# Altium schematic symbol library Linear Technology Comparators.SchLib: 630 symbols (part 16 of 16)
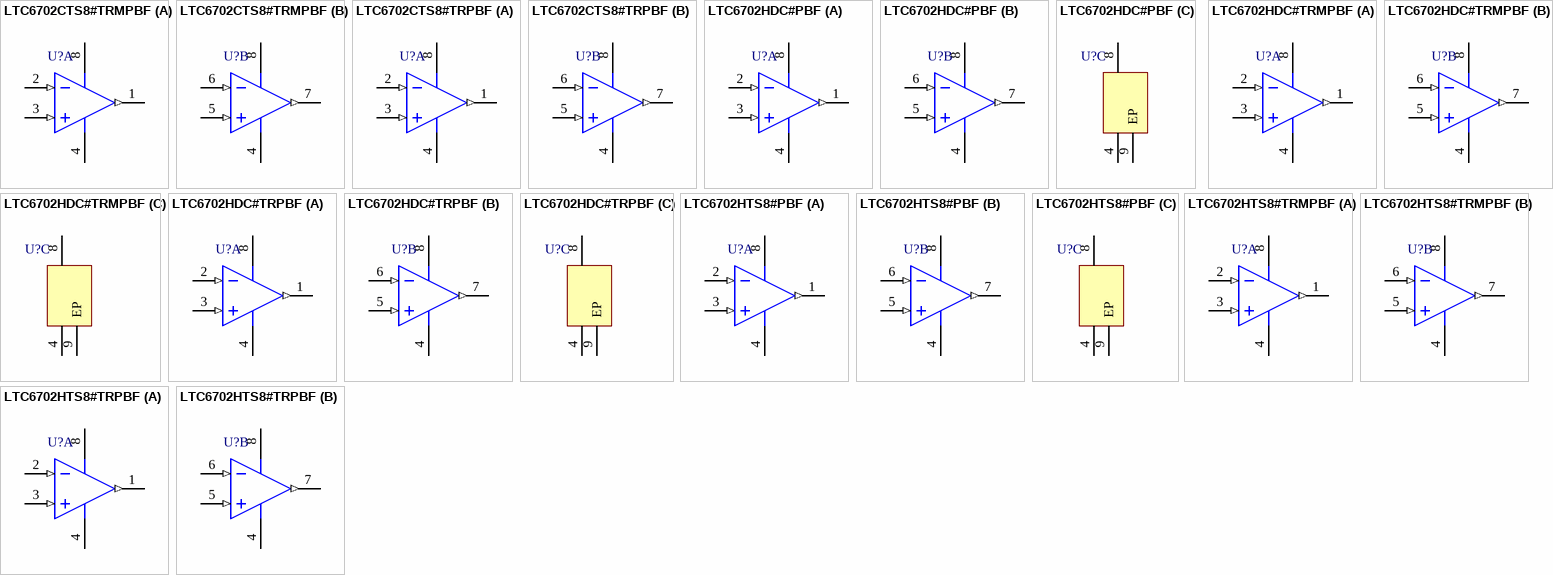
[diagram p39: symbols LTC6702CTS8#TRMPBF to LTC6702HTS8#TRPBF]

## LTC6702HDC#PBF
designator U?
Tiny Micropower, Low Voltage Comparator, 2 Channels, 1.7 to 5.5 V, -40 to +125 degC, 8-pin Plastic DFN (DC8); Generic Part Number: LTC6702; Manufacturer: Linear Technology; PartNumber: LTC6702HDC#PBF; Channels (#): 2; Prop Delay (us): 0.5; Supply Current (uA) Typical: 30; Vos (mV) Guaranteed: 3.5; Vos (mV) Typical: 1; Vs Max (V): 5.5; Vs Min (V): 1.5; DatasheetVersion: Rev A; PackageReference: DC8; PackageDescription: 8-Pin Plastic DFN, Body 2 x 2 mm, Pitch 1.37 mm; Features: Comparator; RoHS: Y; Supply Voltage Range: 1.7 to 5.5 V; Mounting Technology: Surface Mount; ComponentLink1Description: Manufacturer URL; ComponentLink1URL: http://www.linear.com/; ComponentLink2Description: Datasheet; ComponentLink2URL: http://cds.linear.com/docs/en/datasheet/6702fa.pdf; ComponentLink3Description: Package Specification; ComponentLink3URL: http://cds.linear.com/docs/en/packaging/DFN_8_05-08-1719.pdf
footprint LT-DC8_V (SON, 8-Leads, Body 2x2mm, Pitch 0.45mm, Thermal Pad 1.37x0.64mm, Recommended)
pins on every part: 4 GND (power) "Ground.", 8 V+ (power) "Positive Supply Voltage"
part A pins: 1 OUT A (out) "Output of Comparator A.", 2 -IN A (in) "Inverting Input of Comparator A.", 3 +IN A (in) "Noninverting Input of Comparator A."
part B pins: 5 +IN B (in) "Noninverting Input of Comparator B.", 6 -IN B (in) "Inverting Input of Comparator B.", 7 OUT B (out) "Output of Comparator B."
part C pins: 9 EP (power) "Ground. The Exposed Pad must be soldered to PCB."

## LTC6702HDC#TRMPBF
designator U?
Tiny Micropower, Low Voltage Comparator, 2 Channels, 1.7 to 5.5 V, -40 to +125 degC, 8-pin Plastic DFN (DC8), Mini Tape and Reel; Generic Part Number: LTC6702; Manufacturer: Linear Technology; PartNumber: LTC6702HDC#TRMPBF; Channels (#): 2; Prop Delay (us): 0.5; Supply Current (uA) Typical: 30; Vos (mV) Guaranteed: 3.5; Vos (mV) Typical: 1; Vs Max (V): 5.5; Vs Min (V): 1.5; DatasheetVersion: Rev A; PackageReference: DC8; PackageDescription: 8-Pin Plastic DFN, Body 2 x 2 mm, Pitch 1.37 mm; Supplier 1: Digi-Key; Supplier Part Number 1: LTC6702HDC#TRMPBFTR-ND; Supplier 2: Digi-Key; Supplier Part Number 2: LTC6702HDC#TRMPBFCT-ND; Supplier 3: Digi-Key; Supplier Part Number 3: LTC6702HDC#TRMPBFDKR-ND; Supplier 4: Farnell; Supplier Part Number 4: 1715059; Features: Comparator; RoHS: Y; Supply Voltage Range: 1.7 to 5.5 V; Mounting Technology: Surface Mount; ComponentLink1Description: Manufacturer URL; ComponentLink1URL: http://www.linear.com/; ComponentLink2Description: Datasheet; ComponentLink2URL: http://cds.linear.com/docs/en/datasheet/6702fa.pdf; ComponentLink3Description: Package Specification; ComponentLink3URL: http://cds.linear.com/docs/en/packaging/DFN_8_05-08-1719.pdf
footprint LT-DC8_V (SON, 8-Leads, Body 2x2mm, Pitch 0.45mm, Thermal Pad 1.37x0.64mm, Recommended)
pins on every part: 4 GND (power) "Ground.", 8 V+ (power) "Positive Supply Voltage"
part A pins: 1 OUT A (out) "Output of Comparator A.", 2 -IN A (in) "Inverting Input of Comparator A.", 3 +IN A (in) "Noninverting Input of Comparator A."
part B pins: 5 +IN B (in) "Noninverting Input of Comparator B.", 6 -IN B (in) "Inverting Input of Comparator B.", 7 OUT B (out) "Output of Comparator B."
part C pins: 9 EP (power) "Ground. The Exposed Pad must be soldered to PCB."

## LTC6702HDC#TRPBF
designator U?
Tiny Micropower, Low Voltage Comparator, 2 Channels, 1.7 to 5.5 V, -40 to +125 degC, 8-pin Plastic DFN (DC8), Tape and Reel; Generic Part Number: LTC6702; Manufacturer: Linear Technology; PartNumber: LTC6702HDC#TRPBF; Channels (#): 2; Prop Delay (us): 0.5; Supply Current (uA) Typical: 30; Vos (mV) Guaranteed: 3.5; Vos (mV) Typical: 1; Vs Max (V): 5.5; Vs Min (V): 1.5; DatasheetVersion: Rev A; PackageReference: DC8; PackageDescription: 8-Pin Plastic DFN, Body 2 x 2 mm, Pitch 1.37 mm; Supplier 1: Digi-Key; Supplier Part Number 1: LTC6702HDC#TRPBF-ND; Features: Comparator; RoHS: Y; Supply Voltage Range: 1.7 to 5.5 V; Mounting Technology: Surface Mount; ComponentLink1Description: Manufacturer URL; ComponentLink1URL: http://www.linear.com/; ComponentLink2Description: Datasheet; ComponentLink2URL: http://cds.linear.com/docs/en/datasheet/6702fa.pdf; ComponentLink3Description: Package Specification; ComponentLink3URL: http://cds.linear.com/docs/en/packaging/DFN_8_05-08-1719.pdf
footprint LT-DC8_V (SON, 8-Leads, Body 2x2mm, Pitch 0.45mm, Thermal Pad 1.37x0.64mm, Recommended)
pins on every part: 4 GND (power) "Ground.", 8 V+ (power) "Positive Supply Voltage"
part A pins: 1 OUT A (out) "Output of Comparator A.", 2 -IN A (in) "Inverting Input of Comparator A.", 3 +IN A (in) "Noninverting Input of Comparator A."
part B pins: 5 +IN B (in) "Noninverting Input of Comparator B.", 6 -IN B (in) "Inverting Input of Comparator B.", 7 OUT B (out) "Output of Comparator B."
part C pins: 9 EP (power) "Ground. The Exposed Pad must be soldered to PCB."

## LTC6702HTS8#PBF
designator U?
Tiny Micropower, Low Voltage Comparator, 2 Channels, 1.7 to 5.5 V, -40 to +125 degC, 8-pin Plastic DFN (DC8); Generic Part Number: LTC6702; Manufacturer: Linear Technology; PartNumber: LTC6702HTS8#PBF; Channels (#): 2; Prop Delay (us): 0.5; Supply Current (uA) Typical: 30; Vos (mV) Guaranteed: 3.5; Vos (mV) Typical: 1; Vs Max (V): 5.5; Vs Min (V): 1.5; DatasheetVersion: Rev A; PackageReference: DC8; PackageDescription: 8-Pin Plastic DFN, Body 2 x 2 mm, Pitch 1.37 mm; Supplier 1: Farnell; Supplier Part Number 1: 2308164; Supplier 2: Newark; Supplier Part Number 2: 78T3487; Features: Comparator; RoHS: Y; Supply Voltage Range: 1.7 to 5.5 V; Mounting Technology: Surface Mount; ComponentLink1Description: Manufacturer URL; ComponentLink1URL: http://www.linear.com/; ComponentLink2Description: Datasheet; ComponentLink2URL: http://cds.linear.com/docs/en/datasheet/6702fa.pdf; ComponentLink3Description: Package Specification; ComponentLink3URL: http://cds.linear.com/docs/en/packaging/DFN_8_05-08-1719.pdf
footprint LT-DC8_V (SON, 8-Leads, Body 2x2mm, Pitch 0.45mm, Thermal Pad 1.37x0.64mm, Recommended)
pins on every part: 4 GND (power) "Ground.", 8 V+ (power) "Positive Supply Voltage"
part A pins: 1 OUT A (out) "Output of Comparator A.", 2 -IN A (in) "Inverting Input of Comparator A.", 3 +IN A (in) "Noninverting Input of Comparator A."
part B pins: 5 +IN B (in) "Noninverting Input of Comparator B.", 6 -IN B (in) "Inverting Input of Comparator B.", 7 OUT B (out) "Output of Comparator B."
part C pins: 9 EP (power) "Ground. The Exposed Pad must be soldered to PCB."

## LTC6702HTS8#TRMPBF
designator U?
Tiny Micropower, Low Voltage Comparator, 2 Channels, 1.7 to 5.5 V, -40 to +125 degC, 8-pin Plastic TSOT-23 (TS8), Mini Tape and Reel; Generic Part Number: LTC6702; Manufacturer: Linear Technology; PartNumber: LTC6702HTS8#TRMPBF; Channels (#): 2; Prop Delay (us): 0.5; Supply Current (uA) Typical: 30; Vos (mV) Guaranteed: 3.5; Vos (mV) Typical: 1; Vs Max (V): 5.5; Vs Min (V): 1.5; DatasheetVersion: Rev A; PackageVersion: Rev A; PackageReference: TS8-8; PackageDescription: 8-Pin Plastic TSOT-23, Body 2.9 x 1.63 mm, Pitch 0.65 mm; Supplier 1: Digi-Key; Supplier Part Number 1: LTC6702HTS8#TRMPBFTR-ND; Supplier 2: Digi-Key; Supplier Part Number 2: LTC6702HTS8#TRMPBFCT-ND; Supplier 3: Digi-Key; Supplier Part Number 3: LTC6702HTS8#TRMPBFDKR-ND; Supplier 4: Farnell; Supplier Part Number 4: 1715060; Supplier 5: Newark; Supplier Part Number 5: 79M3630; Features: Comparator; RoHS: Y; Supply Voltage Range: 1.7 to 5.5 V; Mounting Technology: Surface Mount; Code_JEDEC: MO-193; ComponentLink1Description: Manufacturer URL; ComponentLink1URL: http://www.linear.com/; ComponentLink2Description: Datasheet; ComponentLink2URL: http://cds.linear.com/docs/en/datasheet/6702fa.pdf; ComponentLink3Description: Package Specification; ComponentLink3URL: http://cds.linear.com/docs/en/packaging/SOT_8_05-08-1637.pdf
footprint LT-TS8-8-TSOT-23_V (SOT23, 8-Leads, Body 2.90x1.63mm, Pitch 0.65mm, Recommended)
pins on every part: 4 GND (power) "Ground.", 8 V+ (power) "Positive Supply Voltage."
part A pins: 1 OUT A (out) "Output of Comparator A.", 2 -IN A (in) "Inverting Input of Comparator A.", 3 +IN A (in) "Noninverting Input of Comparator A."
part B pins: 5 +IN B (in) "Noninverting Input of Comparator B.", 6 -IN B (in) "Inverting Input of Comparator B.", 7 OUT B (out) "Output of Comparator B."

## LTC6702HTS8#TRPBF
designator U?
Tiny Micropower, Low Voltage Comparator, 2 Channels, 1.7 to 5.5 V, -40 to +125 degC, 8-pin Plastic TSOT-23 (TS8), Tape and Reel; Generic Part Number: LTC6702; Manufacturer: Linear Technology; PartNumber: LTC6702HTS8#TRPBF; Channels (#): 2; Prop Delay (us): 0.5; Supply Current (uA) Typical: 30; Vos (mV) Guaranteed: 3.5; Vos (mV) Typical: 1; Vs Max (V): 5.5; Vs Min (V): 1.5; DatasheetVersion: Rev A; PackageVersion: Rev A; PackageReference: TS8-8; PackageDescription: 8-Pin Plastic TSOT-23, Body 2.9 x 1.63 mm, Pitch 0.65 mm; Supplier 1: Digi-Key; Supplier Part Number 1: LTC6702HTS8#TRPBF-ND; Features: Comparator; RoHS: Y; Supply Voltage Range: 1.7 to 5.5 V; Mounting Technology: Surface Mount; Code_JEDEC: MO-193; ComponentLink1Description: Manufacturer URL; ComponentLink1URL: http://www.linear.com/; ComponentLink2Description: Datasheet; ComponentLink2URL: http://cds.linear.com/docs/en/datasheet/6702fa.pdf; ComponentLink3Description: Package Specification; ComponentLink3URL: http://cds.linear.com/docs/en/packaging/SOT_8_05-08-1637.pdf
footprint LT-TS8-8-TSOT-23_V (SOT23, 8-Leads, Body 2.90x1.63mm, Pitch 0.65mm, Recommended)
pins on every part: 4 GND (power) "Ground.", 8 V+ (power) "Positive Supply Voltage."
part A pins: 1 OUT A (out) "Output of Comparator A.", 2 -IN A (in) "Inverting Input of Comparator A.", 3 +IN A (in) "Noninverting Input of Comparator A."
part B pins: 5 +IN B (in) "Noninverting Input of Comparator B.", 6 -IN B (in) "Inverting Input of Comparator B.", 7 OUT B (out) "Output of Comparator B."